# Altium schematic symbol library jlcpcb_2025_04_capacitors_extended_0201.schlib: 1175 symbols (part 6 of 7) (continued)
## GRM0335C1H151FA01D
designator C?  Capacitance: 150pF  (hidden comment: *)
Capacitor, Ceramic (MLCC), 150pF, ±1%, 50V, C0G, ±1%, SMD 0201; Manufacturer: Murata Electronics; Manufacturer Part Number: GRM0335C1H151FA01D; Package Size: 0201; JLCPCB Basic Part: No; JLCPCB Part Number: C384963; Supplier 1: LCSC; Category: Capacitors - MLCC; Supplier Part Number 1: C384963; Tolerance: ±1%; Voltage Rating: 50V; Temperature Coefficient: C0G; RoHS: Yes; ComponentLink1Description: Datasheet; ComponentLink1URL: https://wmsc.lcsc.com/wmsc/upload/file/pdf/v2/lcsc/2304140030_Murata-Electronics-GRM0335C1H151FA01D_C384963.pdf; ComponentLink2Description: JLCPCB Part URL; ComponentLink2URL: https://jlcpcb.com/partdetail/C384963; ComponentLink3Description: LCSC Part URL; ComponentLink3URL: https://lcsc.com/product-detail/Multilayer-Ceramic-Capacitors-MLCC---SMD-SMT_Murata-Electronics-Murata-Electronics-GRM0335C1H151FA01D_C384963.html
footprint CAP-0201 (0201 (0603M) Capacitor)
pins: 1, 2

## GRM0335C1H151JA01D
designator C?  Capacitance: 150pF  (hidden comment: *)
Capacitor, Ceramic (MLCC), 150pF, ±5%, 50V, C0G, ±5%, SMD 0201; Manufacturer: Murata Electronics; Manufacturer Part Number: GRM0335C1H151JA01D; Package Size: 0201; JLCPCB Basic Part: No; JLCPCB Part Number: C161408; Supplier 1: LCSC; Category: Capacitors - MLCC; Supplier Part Number 1: C161408; Tolerance: ±5%; Voltage Rating: 50V; Temperature Coefficient: C0G; RoHS: Yes; ComponentLink1Description: Datasheet; ComponentLink1URL: https://wmsc.lcsc.com/wmsc/upload/file/pdf/v2/lcsc/1912111437_Murata-Electronics-GRM0335C1H151JA01D_C161408.pdf; ComponentLink2Description: JLCPCB Part URL; ComponentLink2URL: https://jlcpcb.com/partdetail/C161408; ComponentLink3Description: LCSC Part URL; ComponentLink3URL: https://lcsc.com/product-detail/Multilayer-Ceramic-Capacitors-MLCC---SMD-SMT_Murata-Electronics-Murata-Electronics-GRM0335C1H151JA01D_C161408.html
footprint CAP-0201 (0201 (0603M) Capacitor)
pins: 1, 2

## GRM0335C1H160GA01D
designator C?  Capacitance: 16pF  (hidden comment: *)
Capacitor, Ceramic (MLCC), 16pF, ±2%, 50V, C0G, ±2%, SMD 0201; Manufacturer: Murata Electronics; Manufacturer Part Number: GRM0335C1H160GA01D; Package Size: 0201; JLCPCB Basic Part: No; JLCPCB Part Number: C384965; Supplier 1: LCSC; Category: Capacitors - MLCC; Supplier Part Number 1: C384965; Tolerance: ±2%; Voltage Rating: 50V; Temperature Coefficient: C0G; RoHS: Yes; ComponentLink1Description: Datasheet; ComponentLink1URL: https://wmsc.lcsc.com/wmsc/upload/file/pdf/v2/lcsc/2304140030_Murata-Electronics-GRM0335C1H160GA01D_C384965.pdf; ComponentLink2Description: JLCPCB Part URL; ComponentLink2URL: https://jlcpcb.com/partdetail/C384965; ComponentLink3Description: LCSC Part URL; ComponentLink3URL: https://lcsc.com/product-detail/Multilayer-Ceramic-Capacitors-MLCC---SMD-SMT_Murata-Electronics-Murata-Electronics-GRM0335C1H160GA01D_C384965.html
footprint CAP-0201 (0201 (0603M) Capacitor)
pins: 1, 2

## GRM0335C1H160JA01D
designator C?  Capacitance: 16pF  (hidden comment: *)
Capacitor, Ceramic (MLCC), 16pF, ±5%, 50V, C0G, ±5%, SMD 0201; Manufacturer: Murata Electronics; Manufacturer Part Number: GRM0335C1H160JA01D; Package Size: 0201; JLCPCB Basic Part: No; JLCPCB Part Number: C384966; Supplier 1: LCSC; Category: Capacitors - MLCC; Supplier Part Number 1: C384966; Tolerance: ±5%; Voltage Rating: 50V; Temperature Coefficient: C0G; RoHS: Yes; ComponentLink1Description: Datasheet; ComponentLink1URL: https://wmsc.lcsc.com/wmsc/upload/file/pdf/v2/lcsc/2304140030_Murata-Electronics-GRM0335C1H160JA01D_C384966.pdf; ComponentLink2Description: JLCPCB Part URL; ComponentLink2URL: https://jlcpcb.com/partdetail/C384966; ComponentLink3Description: LCSC Part URL; ComponentLink3URL: https://lcsc.com/product-detail/Multilayer-Ceramic-Capacitors-MLCC---SMD-SMT_Murata-Electronics-Murata-Electronics-GRM0335C1H160JA01D_C384966.html
footprint CAP-0201 (0201 (0603M) Capacitor)
pins: 1, 2

## GRM0335C1H180GA01D
designator C?  Capacitance: 18pF  (hidden comment: *)
Capacitor, Ceramic (MLCC), 18pF, ±2%, 50V, C0G, ±2%, SMD 0201; Manufacturer: Murata Electronics; Manufacturer Part Number: GRM0335C1H180GA01D; Package Size: 0201; JLCPCB Basic Part: No; JLCPCB Part Number: C161409; Supplier 1: LCSC; Category: Capacitors - MLCC; Supplier Part Number 1: C161409; Tolerance: ±2%; Voltage Rating: 50V; Temperature Coefficient: C0G; RoHS: Yes; ComponentLink1Description: Datasheet; ComponentLink1URL: https://wmsc.lcsc.com/wmsc/upload/file/pdf/v2/lcsc/2304140030_Murata-Electronics-GRM0335C1H180GA01D_C161409.pdf; ComponentLink2Description: JLCPCB Part URL; ComponentLink2URL: https://jlcpcb.com/partdetail/C161409; ComponentLink3Description: LCSC Part URL; ComponentLink3URL: https://lcsc.com/product-detail/Multilayer-Ceramic-Capacitors-MLCC---SMD-SMT_Murata-Electronics-Murata-Electronics-GRM0335C1H180GA01D_C161409.html
footprint CAP-0201 (0201 (0603M) Capacitor)
pins: 1, 2

## GRM0335C1H180JA01D
designator C?  Capacitance: 18pF  (hidden comment: *)
Capacitor, Ceramic (MLCC), 18pF, ±5%, 50V, C0G, ±5%, SMD 0201; Manufacturer: Murata Electronics; Manufacturer Part Number: GRM0335C1H180JA01D; Package Size: 0201; JLCPCB Basic Part: No; JLCPCB Part Number: C85892; Supplier 1: LCSC; Category: Capacitors - MLCC; Supplier Part Number 1: C85892; Tolerance: ±5%; Voltage Rating: 50V; Temperature Coefficient: C0G; RoHS: Yes; ComponentLink1Description: Datasheet; ComponentLink1URL: https://wmsc.lcsc.com/wmsc/upload/file/pdf/v2/lcsc/2304140030_Murata-Electronics-GRM0335C1H180JA01D_C85892.pdf; ComponentLink2Description: JLCPCB Part URL; ComponentLink2URL: https://jlcpcb.com/partdetail/C85892; ComponentLink3Description: LCSC Part URL; ComponentLink3URL: https://lcsc.com/product-detail/Multilayer-Ceramic-Capacitors-MLCC---SMD-SMT_Murata-Electronics-Murata-Electronics-GRM0335C1H180JA01D_C85892.html
footprint CAP-0201 (0201 (0603M) Capacitor)
pins: 1, 2

## GRM0335C1H181FA01D
designator C?  Capacitance: 180pF  (hidden comment: *)
Capacitor, Ceramic (MLCC), 180pF, ±1%, 50V, C0G, ±1%, SMD 0201; Manufacturer: Murata Electronics; Manufacturer Part Number: GRM0335C1H181FA01D; Package Size: 0201; JLCPCB Basic Part: No; JLCPCB Part Number: C384968; Supplier 1: LCSC; Category: Capacitors - MLCC; Supplier Part Number 1: C384968; Tolerance: ±1%; Voltage Rating: 50V; Temperature Coefficient: C0G; RoHS: Yes; ComponentLink1Description: Datasheet; ComponentLink1URL: https://wmsc.lcsc.com/wmsc/upload/file/pdf/v2/lcsc/2304140030_Murata-Electronics-GRM0335C1H181FA01D_C384968.pdf; ComponentLink2Description: JLCPCB Part URL; ComponentLink2URL: https://jlcpcb.com/partdetail/C384968; ComponentLink3Description: LCSC Part URL; ComponentLink3URL: https://lcsc.com/product-detail/Multilayer-Ceramic-Capacitors-MLCC---SMD-SMT_Murata-Electronics-Murata-Electronics-GRM0335C1H181FA01D_C384968.html
footprint CAP-0201 (0201 (0603M) Capacitor)
pins: 1, 2

## GRM0335C1H181GA01D
designator C?  Capacitance: 180pF  (hidden comment: *)
Capacitor, Ceramic (MLCC), 180pF, ±2%, 50V, C0G, ±2%, SMD 0201; Manufacturer: Murata Electronics; Manufacturer Part Number: GRM0335C1H181GA01D; Package Size: 0201; JLCPCB Basic Part: No; JLCPCB Part Number: C437512; Supplier 1: LCSC; Category: Capacitors - MLCC; Supplier Part Number 1: C437512; Tolerance: ±2%; Voltage Rating: 50V; Temperature Coefficient: C0G; RoHS: Yes; ComponentLink1Description: Datasheet; ComponentLink1URL: https://wmsc.lcsc.com/wmsc/upload/file/pdf/v2/lcsc/2111031830_Murata-Electronics-GRM0335C1H181GA01D_C437512.pdf; ComponentLink2Description: JLCPCB Part URL; ComponentLink2URL: https://jlcpcb.com/partdetail/C437512; ComponentLink3Description: LCSC Part URL; ComponentLink3URL: https://lcsc.com/product-detail/Multilayer-Ceramic-Capacitors-MLCC---SMD-SMT_Murata-Electronics-Murata-Electronics-GRM0335C1H181GA01D_C437512.html
footprint CAP-0201 (0201 (0603M) Capacitor)
pins: 1, 2

## GRM0335C1H181JA01D
designator C?  Capacitance: 180pF  (hidden comment: *)
Capacitor, Ceramic (MLCC), 180pF, ±5%, 50V, C0G, ±5%, SMD 0201; Manufacturer: Murata Electronics; Manufacturer Part Number: GRM0335C1H181JA01D; Package Size: 0201; JLCPCB Basic Part: No; JLCPCB Part Number: C161410; Supplier 1: LCSC; Category: Capacitors - MLCC; Supplier Part Number 1: C161410; Tolerance: ±5%; Voltage Rating: 50V; Temperature Coefficient: C0G; RoHS: Yes; ComponentLink1Description: Datasheet; ComponentLink1URL: https://wmsc.lcsc.com/wmsc/upload/file/pdf/v2/lcsc/1811081546_Murata-Electronics-GRM0335C1H181JA01D_C161410.pdf; ComponentLink2Description: JLCPCB Part URL; ComponentLink2URL: https://jlcpcb.com/partdetail/C161410; ComponentLink3Description: LCSC Part URL; ComponentLink3URL: https://lcsc.com/product-detail/Multilayer-Ceramic-Capacitors-MLCC---SMD-SMT_Murata-Electronics-Murata-Electronics-GRM0335C1H181JA01D_C161410.html
footprint CAP-0201 (0201 (0603M) Capacitor)
pins: 1, 2

## GRM0335C1H200GA01D
designator C?  Capacitance: 20pF  (hidden comment: *)
Capacitor, Ceramic (MLCC), 20pF, ±2%, 50V, C0G, ±2%, SMD 0201; Manufacturer: Murata Electronics; Manufacturer Part Number: GRM0335C1H200GA01D; Package Size: 0201; JLCPCB Basic Part: No; JLCPCB Part Number: C384973; Supplier 1: LCSC; Category: Capacitors - MLCC; Supplier Part Number 1: C384973; Tolerance: ±2%; Voltage Rating: 50V; Temperature Coefficient: C0G; RoHS: Yes; ComponentLink1Description: Datasheet; ComponentLink1URL: https://wmsc.lcsc.com/wmsc/upload/file/pdf/v2/lcsc/2304140030_Murata-Electronics-GRM0335C1H200GA01D_C384973.pdf; ComponentLink2Description: JLCPCB Part URL; ComponentLink2URL: https://jlcpcb.com/partdetail/C384973; ComponentLink3Description: LCSC Part URL; ComponentLink3URL: https://lcsc.com/product-detail/Multilayer-Ceramic-Capacitors-MLCC---SMD-SMT_Murata-Electronics-Murata-Electronics-GRM0335C1H200GA01D_C384973.html
footprint CAP-0201 (0201 (0603M) Capacitor)
pins: 1, 2

## GRM0335C1H200JA01D
designator C?  Capacitance: 20pF  (hidden comment: *)
Capacitor, Ceramic (MLCC), 20pF, ±5%, 50V, C0G, ±5%, SMD 0201; Manufacturer: Murata Electronics; Manufacturer Part Number: GRM0335C1H200JA01D; Package Size: 0201; JLCPCB Basic Part: No; JLCPCB Part Number: C76923; Supplier 1: LCSC; Category: Capacitors - MLCC; Supplier Part Number 1: C76923; Tolerance: ±5%; Voltage Rating: 50V; Temperature Coefficient: C0G; RoHS: Yes; ComponentLink1Description: Datasheet; ComponentLink1URL: https://wmsc.lcsc.com/wmsc/upload/file/pdf/v2/lcsc/1811081531_Murata-Electronics-GRM0335C1H200JA01D_C76923.pdf; ComponentLink2Description: JLCPCB Part URL; ComponentLink2URL: https://jlcpcb.com/partdetail/C76923; ComponentLink3Description: LCSC Part URL; ComponentLink3URL: https://lcsc.com/product-detail/Multilayer-Ceramic-Capacitors-MLCC---SMD-SMT_Murata-Electronics-Murata-Electronics-GRM0335C1H200JA01D_C76923.html
footprint CAP-0201 (0201 (0603M) Capacitor)
pins: 1, 2

## GRM0335C1H220GA01D
designator C?  Capacitance: 22pF  (hidden comment: *)
Capacitor, Ceramic (MLCC), 22pF, ±2%, 50V, C0G, ±2%, SMD 0201; Manufacturer: Murata Electronics; Manufacturer Part Number: GRM0335C1H220GA01D; Package Size: 0201; JLCPCB Basic Part: No; JLCPCB Part Number: C161417; Supplier 1: LCSC; Category: Capacitors - MLCC; Supplier Part Number 1: C161417; Tolerance: ±2%; Voltage Rating: 50V; Temperature Coefficient: C0G; RoHS: Yes; ComponentLink1Description: Datasheet; ComponentLink1URL: https://wmsc.lcsc.com/wmsc/upload/file/pdf/v2/lcsc/1811081546_Murata-Electronics-GRM0335C1H220GA01D_C161417.pdf; ComponentLink2Description: JLCPCB Part URL; ComponentLink2URL: https://jlcpcb.com/partdetail/C161417; ComponentLink3Description: LCSC Part URL; ComponentLink3URL: https://lcsc.com/product-detail/Multilayer-Ceramic-Capacitors-MLCC---SMD-SMT_Murata-Electronics-Murata-Electronics-GRM0335C1H220GA01D_C161417.html
footprint CAP-0201 (0201 (0603M) Capacitor)
pins: 1, 2

## GRM0335C1H220JA01D
designator C?  Capacitance: 22pF  (hidden comment: *)
Capacitor, Ceramic (MLCC), 22pF, ±5%, 50V, C0G, ±5%, SMD 0201; Manufacturer: Murata Electronics; Manufacturer Part Number: GRM0335C1H220JA01D; Package Size: 0201; JLCPCB Basic Part: No; JLCPCB Part Number: C76924; Supplier 1: LCSC; Category: Capacitors - MLCC; Supplier Part Number 1: C76924; Tolerance: ±5%; Voltage Rating: 50V; Temperature Coefficient: C0G; RoHS: Yes; ComponentLink1Description: Datasheet; ComponentLink1URL: https://wmsc.lcsc.com/wmsc/upload/file/pdf/v2/lcsc/1811081513_Murata-Electronics-GRM0335C1H220JA01D_C76924.pdf; ComponentLink2Description: JLCPCB Part URL; ComponentLink2URL: https://jlcpcb.com/partdetail/C76924; ComponentLink3Description: LCSC Part URL; ComponentLink3URL: https://lcsc.com/product-detail/Multilayer-Ceramic-Capacitors-MLCC---SMD-SMT_Murata-Electronics-Murata-Electronics-GRM0335C1H220JA01D_C76924.html
footprint CAP-0201 (0201 (0603M) Capacitor)
pins: 1, 2

## GRM0335C1H221FA01D
designator C?  Capacitance: 220pF  (hidden comment: *)
Capacitor, Ceramic (MLCC), 220pF, ±1%, 50V, null, ±1%, SMD 0201; Manufacturer: Murata Electronics; Manufacturer Part Number: GRM0335C1H221FA01D; Package Size: 0201; JLCPCB Basic Part: No; JLCPCB Part Number: C1864404; Supplier 1: LCSC; Category: Capacitors - MLCC; Supplier Part Number 1: C1864404; Tolerance: ±1%; Voltage Rating: 50V; Temperature Coefficient: null; RoHS: Yes; ComponentLink1Description: Datasheet; ComponentLink1URL: https://wmsc.lcsc.com/wmsc/upload/file/pdf/v2/lcsc/2201271800_Murata-Electronics-GRM0335C1H221FA01D_C1864404.pdf; ComponentLink2Description: JLCPCB Part URL; ComponentLink2URL: https://jlcpcb.com/partdetail/C1864404; ComponentLink3Description: LCSC Part URL; ComponentLink3URL: https://lcsc.com/product-detail/Multilayer-Ceramic-Capacitors-MLCC---SMD-SMT_Murata-Electronics-Murata-Electronics-GRM0335C1H221FA01D_C1864404.html
footprint CAP-0201 (0201 (0603M) Capacitor)
pins: 1, 2

## GRM0335C1H221GA01D
designator C?  Capacitance: 220pF  (hidden comment: *)
Capacitor, Ceramic (MLCC), 220pF, ±2%, 50V, C0G, ±2%, SMD 0201; Manufacturer: Murata Electronics; Manufacturer Part Number: GRM0335C1H221GA01D; Package Size: 0201; JLCPCB Basic Part: No; JLCPCB Part Number: C527981; Supplier 1: LCSC; Category: Capacitors - MLCC; Supplier Part Number 1: C527981; Tolerance: ±2%; Voltage Rating: 50V; Temperature Coefficient: C0G; RoHS: Yes; ComponentLink1Description: Datasheet; ComponentLink1URL: https://wmsc.lcsc.com/wmsc/upload/file/pdf/v2/lcsc/2007231106_Murata-Electronics-GRM0335C1H221GA01D_C527981.pdf; ComponentLink2Description: JLCPCB Part URL; ComponentLink2URL: https://jlcpcb.com/partdetail/C527981; ComponentLink3Description: LCSC Part URL; ComponentLink3URL: https://lcsc.com/product-detail/Multilayer-Ceramic-Capacitors-MLCC---SMD-SMT_Murata-Electronics-Murata-Electronics-GRM0335C1H221GA01D_C527981.html
footprint CAP-0201 (0201 (0603M) Capacitor)
pins: 1, 2

## GRM0335C1H221JA01D
designator C?  Capacitance: 220pF  (hidden comment: *)
Capacitor, Ceramic (MLCC), 220pF, ±5%, 50V, C0G, ±5%, SMD 0201; Manufacturer: Murata Electronics; Manufacturer Part Number: GRM0335C1H221JA01D; Package Size: 0201; JLCPCB Basic Part: No; JLCPCB Part Number: C161418; Supplier 1: LCSC; Category: Capacitors - MLCC; Supplier Part Number 1: C161418; Tolerance: ±5%; Voltage Rating: 50V; Temperature Coefficient: C0G; RoHS: Yes; ComponentLink1Description: Datasheet; ComponentLink1URL: https://wmsc.lcsc.com/wmsc/upload/file/pdf/v2/lcsc/1811081550_Murata-Electronics-GRM0335C1H221JA01D_C161418.pdf; ComponentLink2Description: JLCPCB Part URL; ComponentLink2URL: https://jlcpcb.com/partdetail/C161418; ComponentLink3Description: LCSC Part URL; ComponentLink3URL: https://lcsc.com/product-detail/Multilayer-Ceramic-Capacitors-MLCC---SMD-SMT_Murata-Electronics-Murata-Electronics-GRM0335C1H221JA01D_C161418.html
footprint CAP-0201 (0201 (0603M) Capacitor)
pins: 1, 2

## GRM0335C1H270FA01D
designator C?  Capacitance: 27pF  (hidden comment: *)
Capacitor, Ceramic (MLCC), 27pF, ±1%, 50V, C0G, ±1%, SMD 0201; Manufacturer: Murata Electronics; Manufacturer Part Number: GRM0335C1H270FA01D; Package Size: 0201; JLCPCB Basic Part: No; JLCPCB Part Number: C384975; Supplier 1: LCSC; Category: Capacitors - MLCC; Supplier Part Number 1: C384975; Tolerance: ±1%; Voltage Rating: 50V; Temperature Coefficient: C0G; RoHS: Yes; ComponentLink1Description: Datasheet; ComponentLink1URL: https://wmsc.lcsc.com/wmsc/upload/file/pdf/v2/lcsc/2304140030_Murata-Electronics-GRM0335C1H270FA01D_C384975.pdf; ComponentLink2Description: JLCPCB Part URL; ComponentLink2URL: https://jlcpcb.com/partdetail/C384975; ComponentLink3Description: LCSC Part URL; ComponentLink3URL: https://lcsc.com/product-detail/Multilayer-Ceramic-Capacitors-MLCC---SMD-SMT_Murata-Electronics-Murata-Electronics-GRM0335C1H270FA01D_C384975.html
footprint CAP-0201 (0201 (0603M) Capacitor)
pins: 1, 2

## GRM0335C1H270GA01D
designator C?  Capacitance: 27pF  (hidden comment: *)
Capacitor, Ceramic (MLCC), 27pF, ±2%, 50V, C0G, ±2%, SMD 0201; Manufacturer: Murata Electronics; Manufacturer Part Number: GRM0335C1H270GA01D; Package Size: 0201; JLCPCB Basic Part: No; JLCPCB Part Number: C384976; Supplier 1: LCSC; Category: Capacitors - MLCC; Supplier Part Number 1: C384976; Tolerance: ±2%; Voltage Rating: 50V; Temperature Coefficient: C0G; RoHS: Yes; ComponentLink1Description: Datasheet; ComponentLink1URL: https://wmsc.lcsc.com/wmsc/upload/file/pdf/v2/lcsc/1912111437_Murata-Electronics-GRM0335C1H270GA01D_C384976.pdf; ComponentLink2Description: JLCPCB Part URL; ComponentLink2URL: https://jlcpcb.com/partdetail/C384976; ComponentLink3Description: LCSC Part URL; ComponentLink3URL: https://lcsc.com/product-detail/Multilayer-Ceramic-Capacitors-MLCC---SMD-SMT_Murata-Electronics-Murata-Electronics-GRM0335C1H270GA01D_C384976.html
footprint CAP-0201 (0201 (0603M) Capacitor)
pins: 1, 2

## GRM0335C1H270JA01D
designator C?  Capacitance: 27pF  (hidden comment: *)
Capacitor, Ceramic (MLCC), 27pF, ±5%, 50V, C0G, ±5%, SMD 0201; Manufacturer: Murata Electronics; Manufacturer Part Number: GRM0335C1H270JA01D; Package Size: 0201; JLCPCB Basic Part: No; JLCPCB Part Number: C85899; Supplier 1: LCSC; Category: Capacitors - MLCC; Supplier Part Number 1: C85899; Tolerance: ±5%; Voltage Rating: 50V; Temperature Coefficient: C0G; RoHS: Yes; ComponentLink1Description: Datasheet; ComponentLink1URL: https://wmsc.lcsc.com/wmsc/upload/file/pdf/v2/lcsc/2304140030_Murata-Electronics-GRM0335C1H270JA01D_C85899.pdf; ComponentLink2Description: JLCPCB Part URL; ComponentLink2URL: https://jlcpcb.com/partdetail/C85899; ComponentLink3Description: LCSC Part URL; ComponentLink3URL: https://lcsc.com/product-detail/Multilayer-Ceramic-Capacitors-MLCC---SMD-SMT_Murata-Electronics-Murata-Electronics-GRM0335C1H270JA01D_C85899.html
footprint CAP-0201 (0201 (0603M) Capacitor)
pins: 1, 2

## GRM0335C1H300FA01D
designator C?  Capacitance: 30pF  (hidden comment: *)
Capacitor, Ceramic (MLCC), 30pF, ±1%, 50V, C0G, ±1%, SMD 0201; Manufacturer: Murata Electronics; Manufacturer Part Number: GRM0335C1H300FA01D; Package Size: 0201; JLCPCB Basic Part: No; JLCPCB Part Number: C384980; Supplier 1: LCSC; Category: Capacitors - MLCC; Supplier Part Number 1: C384980; Tolerance: ±1%; Voltage Rating: 50V; Temperature Coefficient: C0G; RoHS: Yes; ComponentLink1Description: Datasheet; ComponentLink1URL: https://wmsc.lcsc.com/wmsc/upload/file/pdf/v2/lcsc/2304140030_Murata-Electronics-GRM0335C1H300FA01D_C384980.pdf; ComponentLink2Description: JLCPCB Part URL; ComponentLink2URL: https://jlcpcb.com/partdetail/C384980; ComponentLink3Description: LCSC Part URL; ComponentLink3URL: https://lcsc.com/product-detail/Multilayer-Ceramic-Capacitors-MLCC---SMD-SMT_Murata-Electronics-Murata-Electronics-GRM0335C1H300FA01D_C384980.html
footprint CAP-0201 (0201 (0603M) Capacitor)
pins: 1, 2

## GRM0335C1H300GA01D
designator C?  Capacitance: 30pF  (hidden comment: *)
Capacitor, Ceramic (MLCC), 30pF, ±2%, 50V, C0G, ±2%, SMD 0201; Manufacturer: Murata Electronics; Manufacturer Part Number: GRM0335C1H300GA01D; Package Size: 0201; JLCPCB Basic Part: No; JLCPCB Part Number: C384981; Supplier 1: LCSC; Category: Capacitors - MLCC; Supplier Part Number 1: C384981; Tolerance: ±2%; Voltage Rating: 50V; Temperature Coefficient: C0G; RoHS: Yes; ComponentLink1Description: Datasheet; ComponentLink1URL: https://wmsc.lcsc.com/wmsc/upload/file/pdf/v2/lcsc/2304140030_Murata-Electronics-GRM0335C1H300GA01D_C384981.pdf; ComponentLink2Description: JLCPCB Part URL; ComponentLink2URL: https://jlcpcb.com/partdetail/C384981; ComponentLink3Description: LCSC Part URL; ComponentLink3URL: https://lcsc.com/product-detail/Multilayer-Ceramic-Capacitors-MLCC---SMD-SMT_Murata-Electronics-Murata-Electronics-GRM0335C1H300GA01D_C384981.html
footprint CAP-0201 (0201 (0603M) Capacitor)
pins: 1, 2

## GRM0335C1H330FA01D
designator C?  Capacitance: 33pF  (hidden comment: *)
Capacitor, Ceramic (MLCC), 33pF, ±1%, 50V, C0G, ±1%, SMD 0201; Manufacturer: Murata Electronics; Manufacturer Part Number: GRM0335C1H330FA01D; Package Size: 0201; JLCPCB Basic Part: No; JLCPCB Part Number: C384982; Supplier 1: LCSC; Category: Capacitors - MLCC; Supplier Part Number 1: C384982; Tolerance: ±1%; Voltage Rating: 50V; Temperature Coefficient: C0G; RoHS: Yes; ComponentLink1Description: Datasheet; ComponentLink1URL: https://wmsc.lcsc.com/wmsc/upload/file/pdf/v2/lcsc/2304140030_Murata-Electronics-GRM0335C1H330FA01D_C384982.pdf; ComponentLink2Description: JLCPCB Part URL; ComponentLink2URL: https://jlcpcb.com/partdetail/C384982; ComponentLink3Description: LCSC Part URL; ComponentLink3URL: https://lcsc.com/product-detail/Multilayer-Ceramic-Capacitors-MLCC---SMD-SMT_Murata-Electronics-Murata-Electronics-GRM0335C1H330FA01D_C384982.html
footprint CAP-0201 (0201 (0603M) Capacitor)
pins: 1, 2

## GRM0335C1H330GA01D
designator C?  Capacitance: 33pF  (hidden comment: *)
Capacitor, Ceramic (MLCC), 33pF, ±2%, 50V, C0G, ±2%, SMD 0201; Manufacturer: Murata Electronics; Manufacturer Part Number: GRM0335C1H330GA01D; Package Size: 0201; JLCPCB Basic Part: No; JLCPCB Part Number: C237536; Supplier 1: LCSC; Category: Capacitors - MLCC; Supplier Part Number 1: C237536; Tolerance: ±2%; Voltage Rating: 50V; Temperature Coefficient: C0G; RoHS: Yes; ComponentLink1Description: Datasheet; ComponentLink1URL: https://wmsc.lcsc.com/wmsc/upload/file/pdf/v2/lcsc/2304140030_Murata-Electronics-GRM0335C1H330GA01D_C237536.pdf; ComponentLink2Description: JLCPCB Part URL; ComponentLink2URL: https://jlcpcb.com/partdetail/C237536; ComponentLink3Description: LCSC Part URL; ComponentLink3URL: https://lcsc.com/product-detail/Multilayer-Ceramic-Capacitors-MLCC---SMD-SMT_Murata-Electronics-Murata-Electronics-GRM0335C1H330GA01D_C237536.html
footprint CAP-0201 (0201 (0603M) Capacitor)
pins: 1, 2

## GRM0335C1H330JA01D
designator C?  Capacitance: 33pF  (hidden comment: *)
Capacitor, Ceramic (MLCC), 33pF, ±5%, 50V, C0G, ±5%, SMD 0201; Manufacturer: Murata Electronics; Manufacturer Part Number: GRM0335C1H330JA01D; Package Size: 0201; JLCPCB Basic Part: No; JLCPCB Part Number: C76925; Supplier 1: LCSC; Category: Capacitors - MLCC; Supplier Part Number 1: C76925; Tolerance: ±5%; Voltage Rating: 50V; Temperature Coefficient: C0G; RoHS: Yes; ComponentLink1Description: Datasheet; ComponentLink1URL: https://wmsc.lcsc.com/wmsc/upload/file/pdf/v2/lcsc/1811081531_Murata-Electronics-GRM0335C1H330JA01D_C76925.pdf; ComponentLink2Description: JLCPCB Part URL; ComponentLink2URL: https://jlcpcb.com/partdetail/C76925; ComponentLink3Description: LCSC Part URL; ComponentLink3URL: https://lcsc.com/product-detail/Multilayer-Ceramic-Capacitors-MLCC---SMD-SMT_Murata-Electronics-Murata-Electronics-GRM0335C1H330JA01D_C76925.html
footprint CAP-0201 (0201 (0603M) Capacitor)
pins: 1, 2

## GRM0335C1H331JE01D
designator C?  Capacitance: 330pF  (hidden comment: *)
Capacitor, Ceramic (MLCC), 330pF, ±5%, 50V, C0G, ±5%, SMD 0201; Manufacturer: Murata Electronics; Manufacturer Part Number: GRM0335C1H331JE01D; Package Size: 0201; JLCPCB Basic Part: No; JLCPCB Part Number: C3899460; Supplier 1: LCSC; Category: Capacitors - MLCC; Supplier Part Number 1: C3899460; Tolerance: ±5%; Voltage Rating: 50V; Temperature Coefficient: C0G; RoHS: Yes; ComponentLink1Description: Datasheet; ComponentLink1URL: https://wmsc.lcsc.com/wmsc/upload/file/pdf/v2/lcsc/2308111459_Murata-Electronics-GRM0335C1H331JE01D_C3899460.pdf; ComponentLink2Description: JLCPCB Part URL; ComponentLink2URL: https://jlcpcb.com/partdetail/C3899460; ComponentLink3Description: LCSC Part URL; ComponentLink3URL: https://lcsc.com/product-detail/Multilayer-Ceramic-Capacitors-MLCC---SMD-SMT_Murata-Electronics-Murata-Electronics-GRM0335C1H331JE01D_C3899460.html
footprint CAP-0201 (0201 (0603M) Capacitor)
pins: 1, 2

## GRM0335C1H360GA01D
designator C?  Capacitance: 36pF  (hidden comment: *)
Capacitor, Ceramic (MLCC), 36pF, ±2%, 50V, C0G, ±2%, SMD 0201; Manufacturer: Murata Electronics; Manufacturer Part Number: GRM0335C1H360GA01D; Package Size: 0201; JLCPCB Basic Part: No; JLCPCB Part Number: C384983; Supplier 1: LCSC; Category: Capacitors - MLCC; Supplier Part Number 1: C384983; Tolerance: ±2%; Voltage Rating: 50V; Temperature Coefficient: C0G; RoHS: Yes; ComponentLink1Description: Datasheet; ComponentLink1URL: https://wmsc.lcsc.com/wmsc/upload/file/pdf/v2/lcsc/2304140030_Murata-Electronics-GRM0335C1H360GA01D_C384983.pdf; ComponentLink2Description: JLCPCB Part URL; ComponentLink2URL: https://jlcpcb.com/partdetail/C384983; ComponentLink3Description: LCSC Part URL; ComponentLink3URL: https://lcsc.com/product-detail/Multilayer-Ceramic-Capacitors-MLCC---SMD-SMT_Murata-Electronics-Murata-Electronics-GRM0335C1H360GA01D_C384983.html
footprint CAP-0201 (0201 (0603M) Capacitor)
pins: 1, 2

## GRM0335C1H360JA01D
designator C?  Capacitance: 36pF  (hidden comment: *)
Capacitor, Ceramic (MLCC), 36pF, ±5%, 50V, C0G, ±5%, SMD 0201; Manufacturer: Murata Electronics; Manufacturer Part Number: GRM0335C1H360JA01D; Package Size: 0201; JLCPCB Basic Part: No; JLCPCB Part Number: C161424; Supplier 1: LCSC; Category: Capacitors - MLCC; Supplier Part Number 1: C161424; Tolerance: ±5%; Voltage Rating: 50V; Temperature Coefficient: C0G; RoHS: Yes; ComponentLink1Description: Datasheet; ComponentLink1URL: https://wmsc.lcsc.com/wmsc/upload/file/pdf/v2/lcsc/1811081545_Murata-Electronics-GRM0335C1H360JA01D_C161424.pdf; ComponentLink2Description: JLCPCB Part URL; ComponentLink2URL: https://jlcpcb.com/partdetail/C161424; ComponentLink3Description: LCSC Part URL; ComponentLink3URL: https://lcsc.com/product-detail/Multilayer-Ceramic-Capacitors-MLCC---SMD-SMT_Murata-Electronics-Murata-Electronics-GRM0335C1H360JA01D_C161424.html
footprint CAP-0201 (0201 (0603M) Capacitor)
pins: 1, 2

## GRM0335C1H390FA01D
designator C?  Capacitance: 39pF  (hidden comment: *)
Capacitor, Ceramic (MLCC), 39pF, ±1%, 50V, C0G, ±1%, SMD 0201; Manufacturer: Murata Electronics; Manufacturer Part Number: GRM0335C1H390FA01D; Package Size: 0201; JLCPCB Basic Part: No; JLCPCB Part Number: C3034511; Supplier 1: LCSC; Category: Capacitors - MLCC; Supplier Part Number 1: C3034511; Tolerance: ±1%; Voltage Rating: 50V; Temperature Coefficient: C0G; RoHS: Yes; ComponentLink1Description: Datasheet; ComponentLink1URL: https://wmsc.lcsc.com/wmsc/upload/file/pdf/v2/lcsc/2209091800_Murata-Electronics-GRM0335C1H390FA01D_C3034511.pdf; ComponentLink2Description: JLCPCB Part URL; ComponentLink2URL: https://jlcpcb.com/partdetail/C3034511; ComponentLink3Description: LCSC Part URL; ComponentLink3URL: https://lcsc.com/product-detail/Multilayer-Ceramic-Capacitors-MLCC---SMD-SMT_Murata-Electronics-Murata-Electronics-GRM0335C1H390FA01D_C3034511.html
footprint CAP-0201 (0201 (0603M) Capacitor)
pins: 1, 2

## GRM0335C1H390JA01D
designator C?  Capacitance: 39pF  (hidden comment: *)
Capacitor, Ceramic (MLCC), 39pF, ±5%, 50V, C0G, ±5%, SMD 0201; Manufacturer: Murata Electronics; Manufacturer Part Number: GRM0335C1H390JA01D; Package Size: 0201; JLCPCB Basic Part: No; JLCPCB Part Number: C85904; Supplier 1: LCSC; Category: Capacitors - MLCC; Supplier Part Number 1: C85904; Tolerance: ±5%; Voltage Rating: 50V; Temperature Coefficient: C0G; RoHS: Yes; ComponentLink1Description: Datasheet; ComponentLink1URL: https://wmsc.lcsc.com/wmsc/upload/file/pdf/v2/lcsc/2304140030_Murata-Electronics-GRM0335C1H390JA01D_C85904.pdf; ComponentLink2Description: JLCPCB Part URL; ComponentLink2URL: https://jlcpcb.com/partdetail/C85904; ComponentLink3Description: LCSC Part URL; ComponentLink3URL: https://lcsc.com/product-detail/Multilayer-Ceramic-Capacitors-MLCC---SMD-SMT_Murata-Electronics-Murata-Electronics-GRM0335C1H390JA01D_C85904.html
footprint CAP-0201 (0201 (0603M) Capacitor)
pins: 1, 2

## GRM0335C1H430GA01D
designator C?  Capacitance: 43pF  (hidden comment: *)
Capacitor, Ceramic (MLCC), 43pF, ±2%, 50V, C0G, ±2%, SMD 0201; Manufacturer: Murata Electronics; Manufacturer Part Number: GRM0335C1H430GA01D; Package Size: 0201; JLCPCB Basic Part: No; JLCPCB Part Number: C384992; Supplier 1: LCSC; Category: Capacitors - MLCC; Supplier Part Number 1: C384992; Tolerance: ±2%; Voltage Rating: 50V; Temperature Coefficient: C0G; RoHS: Yes; ComponentLink1Description: Datasheet; ComponentLink1URL: https://wmsc.lcsc.com/wmsc/upload/file/pdf/v2/lcsc/2304140030_Murata-Electronics-GRM0335C1H430GA01D_C384992.pdf; ComponentLink2Description: JLCPCB Part URL; ComponentLink2URL: https://jlcpcb.com/partdetail/C384992; ComponentLink3Description: LCSC Part URL; ComponentLink3URL: https://lcsc.com/product-detail/Multilayer-Ceramic-Capacitors-MLCC---SMD-SMT_Murata-Electronics-Murata-Electronics-GRM0335C1H430GA01D_C384992.html
footprint CAP-0201 (0201 (0603M) Capacitor)
pins: 1, 2

## GRM0335C1H470GA01D
designator C?  Capacitance: 47pF  (hidden comment: *)
Capacitor, Ceramic (MLCC), 47pF, ±2%, 50V, C0G, ±2%, SMD 0201; Manufacturer: Murata Electronics; Manufacturer Part Number: GRM0335C1H470GA01D; Package Size: 0201; JLCPCB Basic Part: No; JLCPCB Part Number: C384994; Supplier 1: LCSC; Category: Capacitors - MLCC; Supplier Part Number 1: C384994; Tolerance: ±2%; Voltage Rating: 50V; Temperature Coefficient: C0G; RoHS: Yes; ComponentLink1Description: Datasheet; ComponentLink1URL: https://wmsc.lcsc.com/wmsc/upload/file/pdf/v2/lcsc/2304140030_Murata-Electronics-GRM0335C1H470GA01D_C384994.pdf; ComponentLink2Description: JLCPCB Part URL; ComponentLink2URL: https://jlcpcb.com/partdetail/C384994; ComponentLink3Description: LCSC Part URL; ComponentLink3URL: https://lcsc.com/product-detail/Multilayer-Ceramic-Capacitors-MLCC---SMD-SMT_Murata-Electronics-Murata-Electronics-GRM0335C1H470GA01D_C384994.html
footprint CAP-0201 (0201 (0603M) Capacitor)
pins: 1, 2

## GRM0335C1H470JA01D
designator C?  Capacitance: 47pF  (hidden comment: *)
Capacitor, Ceramic (MLCC), 47pF, ±5%, 50V, C0G, ±5%, SMD 0201; Manufacturer: Murata Electronics; Manufacturer Part Number: GRM0335C1H470JA01D; Package Size: 0201; JLCPCB Basic Part: No; JLCPCB Part Number: C85908; Supplier 1: LCSC; Category: Capacitors - MLCC; Supplier Part Number 1: C85908; Tolerance: ±5%; Voltage Rating: 50V; Temperature Coefficient: C0G; RoHS: Yes; ComponentLink1Description: Datasheet; ComponentLink1URL: https://wmsc.lcsc.com/wmsc/upload/file/pdf/v2/lcsc/2304140030_Murata-Electronics-GRM0335C1H470JA01D_C85908.pdf; ComponentLink2Description: JLCPCB Part URL; ComponentLink2URL: https://jlcpcb.com/partdetail/C85908; ComponentLink3Description: LCSC Part URL; ComponentLink3URL: https://lcsc.com/product-detail/Multilayer-Ceramic-Capacitors-MLCC---SMD-SMT_Murata-Electronics-Murata-Electronics-GRM0335C1H470JA01D_C85908.html
footprint CAP-0201 (0201 (0603M) Capacitor)
pins: 1, 2

## GRM0335C1H510JA01D
designator C?  Capacitance: 51pF  (hidden comment: *)
Capacitor, Ceramic (MLCC), 51pF, ±5%, 50V, C0G, ±5%, SMD 0201; Manufacturer: Murata Electronics; Manufacturer Part Number: GRM0335C1H510JA01D; Package Size: 0201; JLCPCB Basic Part: No; JLCPCB Part Number: C384998; Supplier 1: LCSC; Category: Capacitors - MLCC; Supplier Part Number 1: C384998; Tolerance: ±5%; Voltage Rating: 50V; Temperature Coefficient: C0G; RoHS: Yes; ComponentLink1Description: Datasheet; ComponentLink1URL: https://wmsc.lcsc.com/wmsc/upload/file/pdf/v2/lcsc/2201242230_Murata-Electronics-GRM0335C1H510JA01D_C384998.pdf; ComponentLink2Description: JLCPCB Part URL; ComponentLink2URL: https://jlcpcb.com/partdetail/C384998; ComponentLink3Description: LCSC Part URL; ComponentLink3URL: https://lcsc.com/product-detail/Multilayer-Ceramic-Capacitors-MLCC---SMD-SMT_Murata-Electronics-Murata-Electronics-GRM0335C1H510JA01D_C384998.html
footprint CAP-0201 (0201 (0603M) Capacitor)
pins: 1, 2

## GRM0335C1H560GA01D
designator C?  Capacitance: 56pF  (hidden comment: *)
Capacitor, Ceramic (MLCC), 56pF, ±2%, 50V, C0G, ±2%, SMD 0201; Manufacturer: Murata Electronics; Manufacturer Part Number: GRM0335C1H560GA01D; Package Size: 0201; JLCPCB Basic Part: No; JLCPCB Part Number: C161429; Supplier 1: LCSC; Category: Capacitors - MLCC; Supplier Part Number 1: C161429; Tolerance: ±2%; Voltage Rating: 50V; Temperature Coefficient: C0G; RoHS: Yes; ComponentLink1Description: Datasheet; ComponentLink1URL: https://wmsc.lcsc.com/wmsc/upload/file/pdf/v2/lcsc/1811081551_Murata-Electronics-GRM0335C1H560GA01D_C161429.pdf; ComponentLink2Description: JLCPCB Part URL; ComponentLink2URL: https://jlcpcb.com/partdetail/C161429; ComponentLink3Description: LCSC Part URL; ComponentLink3URL: https://lcsc.com/product-detail/Multilayer-Ceramic-Capacitors-MLCC---SMD-SMT_Murata-Electronics-Murata-Electronics-GRM0335C1H560GA01D_C161429.html
footprint CAP-0201 (0201 (0603M) Capacitor)
pins: 1, 2

## GRM0335C1H560JA01D
designator C?  Capacitance: 56pF  (hidden comment: *)
Capacitor, Ceramic (MLCC), 56pF, ±5%, 50V, C0G, ±5%, SMD 0201; Manufacturer: Murata Electronics; Manufacturer Part Number: GRM0335C1H560JA01D; Package Size: 0201; JLCPCB Basic Part: No; JLCPCB Part Number: C85912; Supplier 1: LCSC; Category: Capacitors - MLCC; Supplier Part Number 1: C85912; Tolerance: ±5%; Voltage Rating: 50V; Temperature Coefficient: C0G; RoHS: Yes; ComponentLink1Description: Datasheet; ComponentLink1URL: https://wmsc.lcsc.com/wmsc/upload/file/pdf/v2/lcsc/2304140030_Murata-Electronics-GRM0335C1H560JA01D_C85912.pdf; ComponentLink2Description: JLCPCB Part URL; ComponentLink2URL: https://jlcpcb.com/partdetail/C85912; ComponentLink3Description: LCSC Part URL; ComponentLink3URL: https://lcsc.com/product-detail/Multilayer-Ceramic-Capacitors-MLCC---SMD-SMT_Murata-Electronics-Murata-Electronics-GRM0335C1H560JA01D_C85912.html
footprint CAP-0201 (0201 (0603M) Capacitor)
pins: 1, 2

## GRM0335C1H561JE01D
designator C?  Capacitance: 560pF  (hidden comment: *)
Capacitor, Ceramic (MLCC), 560pF, ±5%, 50V, C0G, ±5%, SMD 0201; Manufacturer: Murata Electronics; Manufacturer Part Number: GRM0335C1H561JE01D; Package Size: 0201; JLCPCB Basic Part: No; JLCPCB Part Number: C2976062; Supplier 1: LCSC; Category: Capacitors - MLCC; Supplier Part Number 1: C2976062; Tolerance: ±5%; Voltage Rating: 50V; Temperature Coefficient: C0G; RoHS: Yes; ComponentLink1Description: Datasheet; ComponentLink1URL: https://wmsc.lcsc.com/wmsc/upload/file/pdf/v2/lcsc/2202221130_Murata-Electronics-GRM0335C1H561JE01D_C2976062.pdf; ComponentLink2Description: JLCPCB Part URL; ComponentLink2URL: https://jlcpcb.com/partdetail/C2976062; ComponentLink3Description: LCSC Part URL; ComponentLink3URL: https://lcsc.com/product-detail/Multilayer-Ceramic-Capacitors-MLCC---SMD-SMT_Murata-Electronics-Murata-Electronics-GRM0335C1H561JE01D_C2976062.html
footprint CAP-0201 (0201 (0603M) Capacitor)
pins: 1, 2

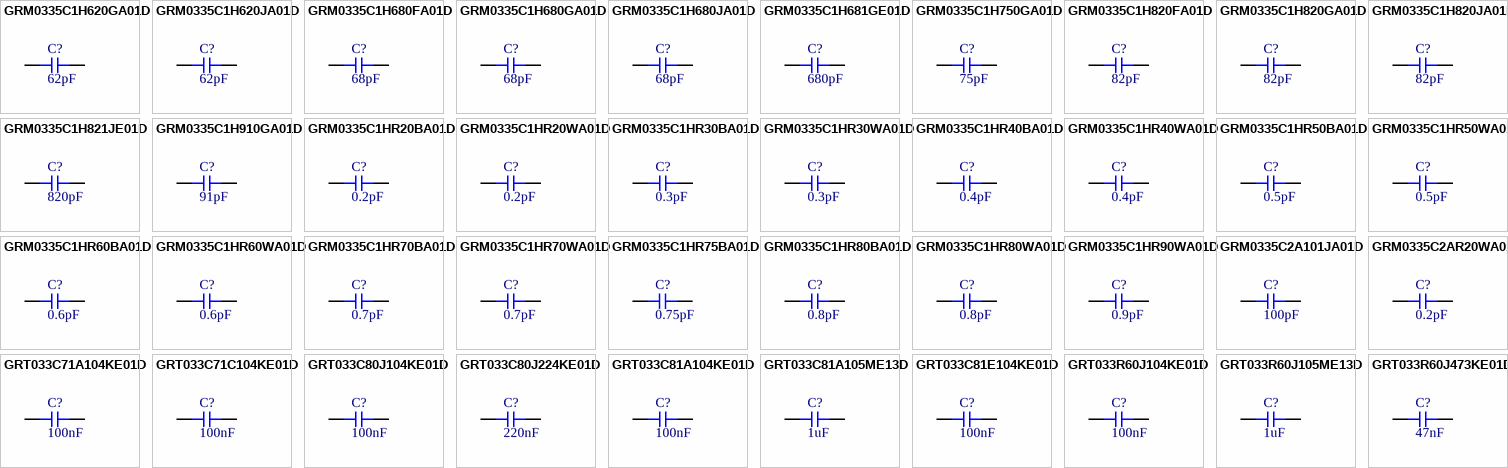
[diagram p25: symbols GRM0335C1H620GA01D to GRT033R60J473KE01D]

## GRM0335C1H620GA01D
designator C?  Capacitance: 62pF  (hidden comment: *)
Capacitor, Ceramic (MLCC), 62pF, ±2%, 50V, C0G, ±2%, SMD 0201; Manufacturer: Murata Electronics; Manufacturer Part Number: GRM0335C1H620GA01D; Package Size: 0201; JLCPCB Basic Part: No; JLCPCB Part Number: C3011639; Supplier 1: LCSC; Category: Capacitors - MLCC; Supplier Part Number 1: C3011639; Tolerance: ±2%; Voltage Rating: 50V; Temperature Coefficient: C0G; RoHS: Yes; ComponentLink1Description: Datasheet; ComponentLink1URL: https://wmsc.lcsc.com/wmsc/upload/file/pdf/v2/lcsc/2208301730_Murata-Electronics-GRM0335C1H620GA01D_C3011639.pdf; ComponentLink2Description: JLCPCB Part URL; ComponentLink2URL: https://jlcpcb.com/partdetail/C3011639; ComponentLink3Description: LCSC Part URL; ComponentLink3URL: https://lcsc.com/product-detail/Multilayer-Ceramic-Capacitors-MLCC---SMD-SMT_Murata-Electronics-Murata-Electronics-GRM0335C1H620GA01D_C3011639.html
footprint CAP-0201 (0201 (0603M) Capacitor)
pins: 1, 2

## GRM0335C1H620JA01D
designator C?  Capacitance: 62pF  (hidden comment: *)
Capacitor, Ceramic (MLCC), 62pF, ±5%, 50V, C0G, ±5%, SMD 0201; Manufacturer: Murata Electronics; Manufacturer Part Number: GRM0335C1H620JA01D; Package Size: 0201; JLCPCB Basic Part: No; JLCPCB Part Number: C161432; Supplier 1: LCSC; Category: Capacitors - MLCC; Supplier Part Number 1: C161432; Tolerance: ±5%; Voltage Rating: 50V; Temperature Coefficient: C0G; RoHS: Yes; ComponentLink1Description: Datasheet; ComponentLink1URL: https://wmsc.lcsc.com/wmsc/upload/file/pdf/v2/lcsc/1811081551_Murata-Electronics-GRM0335C1H620JA01D_C161432.pdf; ComponentLink2Description: JLCPCB Part URL; ComponentLink2URL: https://jlcpcb.com/partdetail/C161432; ComponentLink3Description: LCSC Part URL; ComponentLink3URL: https://lcsc.com/product-detail/Multilayer-Ceramic-Capacitors-MLCC---SMD-SMT_Murata-Electronics-Murata-Electronics-GRM0335C1H620JA01D_C161432.html
footprint CAP-0201 (0201 (0603M) Capacitor)
pins: 1, 2

## GRM0335C1H680FA01D
designator C?  Capacitance: 68pF  (hidden comment: *)
Capacitor, Ceramic (MLCC), 68pF, ±1%, 50V, C0G, ±1%, SMD 0201; Manufacturer: Murata Electronics; Manufacturer Part Number: GRM0335C1H680FA01D; Package Size: 0201; JLCPCB Basic Part: No; JLCPCB Part Number: C385000; Supplier 1: LCSC; Category: Capacitors - MLCC; Supplier Part Number 1: C385000; Tolerance: ±1%; Voltage Rating: 50V; Temperature Coefficient: C0G; RoHS: Yes; ComponentLink1Description: Datasheet; ComponentLink1URL: https://wmsc.lcsc.com/wmsc/upload/file/pdf/v2/lcsc/2209091800_Murata-Electronics-GRM0335C1H680FA01D_C385000.pdf; ComponentLink2Description: JLCPCB Part URL; ComponentLink2URL: https://jlcpcb.com/partdetail/C385000; ComponentLink3Description: LCSC Part URL; ComponentLink3URL: https://lcsc.com/product-detail/Multilayer-Ceramic-Capacitors-MLCC---SMD-SMT_Murata-Electronics-Murata-Electronics-GRM0335C1H680FA01D_C385000.html
footprint CAP-0201 (0201 (0603M) Capacitor)
pins: 1, 2

## GRM0335C1H680GA01D
designator C?  Capacitance: 68pF  (hidden comment: *)
Capacitor, Ceramic (MLCC), 68pF, ±2%, 50V, C0G, ±2%, SMD 0201; Manufacturer: Murata Electronics; Manufacturer Part Number: GRM0335C1H680GA01D; Package Size: 0201; JLCPCB Basic Part: No; JLCPCB Part Number: C161433; Supplier 1: LCSC; Category: Capacitors - MLCC; Supplier Part Number 1: C161433; Tolerance: ±2%; Voltage Rating: 50V; Temperature Coefficient: C0G; RoHS: Yes; ComponentLink1Description: Datasheet; ComponentLink1URL: https://wmsc.lcsc.com/wmsc/upload/file/pdf/v2/lcsc/2304140030_Murata-Electronics-GRM0335C1H680GA01D_C161433.pdf; ComponentLink2Description: JLCPCB Part URL; ComponentLink2URL: https://jlcpcb.com/partdetail/C161433; ComponentLink3Description: LCSC Part URL; ComponentLink3URL: https://lcsc.com/product-detail/Multilayer-Ceramic-Capacitors-MLCC---SMD-SMT_Murata-Electronics-Murata-Electronics-GRM0335C1H680GA01D_C161433.html
footprint CAP-0201 (0201 (0603M) Capacitor)
pins: 1, 2

## GRM0335C1H680JA01D
designator C?  Capacitance: 68pF  (hidden comment: *)
Capacitor, Ceramic (MLCC), 68pF, ±5%, 50V, C0G, ±5%, SMD 0201; Manufacturer: Murata Electronics; Manufacturer Part Number: GRM0335C1H680JA01D; Package Size: 0201; JLCPCB Basic Part: No; JLCPCB Part Number: C88914; Supplier 1: LCSC; Category: Capacitors - MLCC; Supplier Part Number 1: C88914; Tolerance: ±5%; Voltage Rating: 50V; Temperature Coefficient: C0G; RoHS: Yes; ComponentLink1Description: Datasheet; ComponentLink1URL: https://wmsc.lcsc.com/wmsc/upload/file/pdf/v2/lcsc/2304140030_Murata-Electronics-GRM0335C1H680JA01D_C88914.pdf; ComponentLink2Description: JLCPCB Part URL; ComponentLink2URL: https://jlcpcb.com/partdetail/C88914; ComponentLink3Description: LCSC Part URL; ComponentLink3URL: https://lcsc.com/product-detail/Multilayer-Ceramic-Capacitors-MLCC---SMD-SMT_Murata-Electronics-Murata-Electronics-GRM0335C1H680JA01D_C88914.html
footprint CAP-0201 (0201 (0603M) Capacitor)
pins: 1, 2

## GRM0335C1H681GE01D
designator C?  Capacitance: 680pF  (hidden comment: *)
Capacitor, Ceramic (MLCC), 680pF, ±2%, 50V, C0G, ±2%, SMD 0201; Manufacturer: Murata Electronics; Manufacturer Part Number: GRM0335C1H681GE01D; Package Size: 0201; JLCPCB Basic Part: No; JLCPCB Part Number: C2976063; Supplier 1: LCSC; Category: Capacitors - MLCC; Supplier Part Number 1: C2976063; Tolerance: ±2%; Voltage Rating: 50V; Temperature Coefficient: C0G; RoHS: Yes; ComponentLink1Description: Datasheet; ComponentLink1URL: https://wmsc.lcsc.com/wmsc/upload/file/pdf/v2/lcsc/2202221130_Murata-Electronics-GRM0335C1H681GE01D_C2976063.pdf; ComponentLink2Description: JLCPCB Part URL; ComponentLink2URL: https://jlcpcb.com/partdetail/C2976063; ComponentLink3Description: LCSC Part URL; ComponentLink3URL: https://lcsc.com/product-detail/Multilayer-Ceramic-Capacitors-MLCC---SMD-SMT_Murata-Electronics-Murata-Electronics-GRM0335C1H681GE01D_C2976063.html
footprint CAP-0201 (0201 (0603M) Capacitor)
pins: 1, 2

## GRM0335C1H750GA01D
designator C?  Capacitance: 75pF  (hidden comment: *)
Capacitor, Ceramic (MLCC), 75pF, ±2%, null, null, ±2%, SMD 0201; Manufacturer: Murata Electronics; Manufacturer Part Number: GRM0335C1H750GA01D; Package Size: 0201; JLCPCB Basic Part: No; JLCPCB Part Number: C782047; Supplier 1: LCSC; Category: Capacitors - MLCC; Supplier Part Number 1: C782047; Tolerance: ±2%; Voltage Rating: null; Temperature Coefficient: null; RoHS: Yes; ComponentLink1Description: Datasheet; ComponentLink1URL: https://wmsc.lcsc.com/wmsc/upload/file/pdf/v2/lcsc/2009121209_Murata-Electronics-GRM0335C1H750GA01D_C782047.pdf; ComponentLink2Description: JLCPCB Part URL; ComponentLink2URL: https://jlcpcb.com/partdetail/C782047; ComponentLink3Description: LCSC Part URL; ComponentLink3URL: https://lcsc.com/product-detail/Multilayer-Ceramic-Capacitors-MLCC---SMD-SMT_Murata-Electronics-Murata-Electronics-GRM0335C1H750GA01D_C782047.html
footprint CAP-0201 (0201 (0603M) Capacitor)
pins: 1, 2

## GRM0335C1H820FA01D
designator C?  Capacitance: 82pF  (hidden comment: *)
Capacitor, Ceramic (MLCC), 82pF, ±1%, 50V, C0G, ±1%, SMD 0201; Manufacturer: Murata Electronics; Manufacturer Part Number: GRM0335C1H820FA01D; Package Size: 0201; JLCPCB Basic Part: No; JLCPCB Part Number: C385007; Supplier 1: LCSC; Category: Capacitors - MLCC; Supplier Part Number 1: C385007; Tolerance: ±1%; Voltage Rating: 50V; Temperature Coefficient: C0G; RoHS: Yes; ComponentLink1Description: Datasheet; ComponentLink1URL: https://wmsc.lcsc.com/wmsc/upload/file/pdf/v2/lcsc/2209091800_Murata-Electronics-GRM0335C1H820FA01D_C385007.pdf; ComponentLink2Description: JLCPCB Part URL; ComponentLink2URL: https://jlcpcb.com/partdetail/C385007; ComponentLink3Description: LCSC Part URL; ComponentLink3URL: https://lcsc.com/product-detail/Multilayer-Ceramic-Capacitors-MLCC---SMD-SMT_Murata-Electronics-Murata-Electronics-GRM0335C1H820FA01D_C385007.html
footprint CAP-0201 (0201 (0603M) Capacitor)
pins: 1, 2

## GRM0335C1H820GA01D
designator C?  Capacitance: 82pF  (hidden comment: *)
Capacitor, Ceramic (MLCC), 82pF, ±2%, 50V, C0G, ±2%, SMD 0201; Manufacturer: Murata Electronics; Manufacturer Part Number: GRM0335C1H820GA01D; Package Size: 0201; JLCPCB Basic Part: No; JLCPCB Part Number: C161438; Supplier 1: LCSC; Category: Capacitors - MLCC; Supplier Part Number 1: C161438; Tolerance: ±2%; Voltage Rating: 50V; Temperature Coefficient: C0G; RoHS: Yes; ComponentLink1Description: Datasheet; ComponentLink1URL: https://wmsc.lcsc.com/wmsc/upload/file/pdf/v2/lcsc/1811081551_Murata-Electronics-GRM0335C1H820GA01D_C161438.pdf; ComponentLink2Description: JLCPCB Part URL; ComponentLink2URL: https://jlcpcb.com/partdetail/C161438; ComponentLink3Description: LCSC Part URL; ComponentLink3URL: https://lcsc.com/product-detail/Multilayer-Ceramic-Capacitors-MLCC---SMD-SMT_Murata-Electronics-Murata-Electronics-GRM0335C1H820GA01D_C161438.html
footprint CAP-0201 (0201 (0603M) Capacitor)
pins: 1, 2
